# Altium footprint library ARM核心板.PcbLib: 3 footprints
Each footprint in its own frame and in the unit in brackets; x right, y up, seen from the top. Pads: shape width x height; smd on the part's side, far side on the other; paste and mask are expansions set on the pad; w line width, h text height; cw(c..) or ccw(c..) is an arc to the next point about the centre after c.
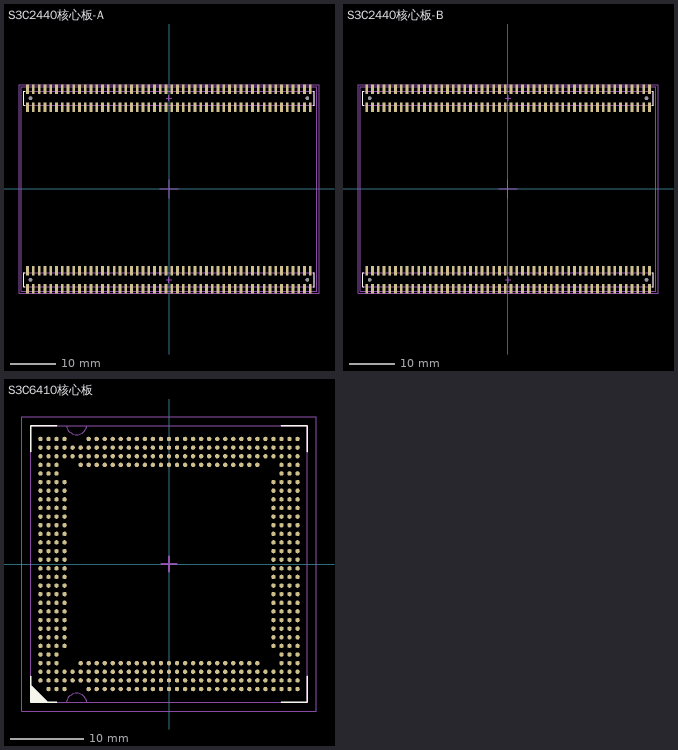
[diagram p0: the footprints below, top view; thin cyan lines are the x and y axes]

## S3C2440核心板-A [mm] "65x45mm S3C2440核心板 淘宝有售"
height 4.4
pads (204):
  rect 0.6x2.05 smd: 1(-31.127,-21.996) 2(-31.127,-18.046) 3(-29.857,-21.996) 4(-29.857,-18.046) 5(-28.587,-21.996) 6(-28.587,-18.046) 7(-27.317,-21.996) 8(-27.317,-18.046) 9(-26.047,-21.996) 10(-26.047,-18.046) 11(-24.777,-21.996) 12(-24.777,-18.046) 13(-23.507,-21.996) 14(-23.507,-18.046) 15(-22.237,-21.996) 16(-22.237,-18.046) 17(-20.967,-21.996) 18(-20.967,-18.046) 19(-19.697,-21.996) 20(-19.697,-18.046) 21(-18.427,-21.996) 22(-18.427,-18.046) 23(-17.157,-21.996) 24(-17.157,-18.046) 25(-15.887,-21.996) 26(-15.887,-18.046) 27(-14.617,-21.996) 28(-14.617,-18.046) 29(-13.347,-21.996) 30(-13.347,-18.046) 31(-12.077,-21.996) 32(-12.077,-18.046) 33(-10.807,-21.996) 34(-10.807,-18.046) 35(-9.537,-21.996) 36(-9.537,-18.046) 37(-8.267,-21.996) 38(-8.267,-18.046) 39(-6.997,-21.996) 40(-6.997,-18.046) 41(-5.727,-21.996) 42(-5.727,-18.046) 43(-4.457,-21.996) 44(-4.457,-18.046) 45(-3.187,-21.996) 46(-3.187,-18.046) 47(-1.917,-21.996) 48(-1.917,-18.046) 49(-0.647,-21.996) 50(-0.647,-18.046) 51(0.623,-21.996) 52(0.623,-18.046) 53(1.893,-21.996) 54(1.893,-18.046) 55(3.163,-21.996) 56(3.163,-18.046) 57(4.433,-21.996) 58(4.433,-18.046) 59(5.703,-21.996) 60(5.703,-18.046) 61(6.973,-21.996) 62(6.973,-18.046) 63(8.243,-21.996) 64(8.243,-18.046) 65(9.513,-21.996) 66(9.513,-18.046) 67(10.783,-21.996) 68(10.783,-18.046) 69(12.053,-21.996) 70(12.053,-18.046) 71(13.323,-21.996) 72(13.323,-18.046) 73(14.593,-21.996) 74(14.593,-18.046) 75(15.863,-21.996) 76(15.863,-18.046) 77(17.133,-21.996) 78(17.133,-18.046) 79(18.403,-21.996) 80(18.403,-18.046) 81(19.673,-21.996) 82(19.673,-18.046) 83(20.943,-21.996) 84(20.943,-18.046) 85(22.213,-21.996) 86(22.213,-18.046) 87(23.483,-21.996) 88(23.483,-18.046) 89(24.753,-21.996) 90(24.753,-18.046) 91(26.023,-21.996) 92(26.023,-18.046) 93(27.293,-21.996) 94(27.293,-18.046) 95(28.563,-21.996) 96(28.563,-18.046) 97(29.833,-21.996) 98(29.833,-18.046) 99(31.103,-21.996) 100(31.103,-18.046) 101(-31.127,18.004) 102(-31.127,21.954) 103(-29.857,18.004) 104(-29.857,21.954) 105(-28.587,18.004) 106(-28.587,21.954) 107(-27.317,18.004) 108(-27.317,21.954) 109(-26.047,18.004) 110(-26.047,21.954) 111(-24.777,18.004) 112(-24.777,21.954) 113(-23.507,18.004) 114(-23.507,21.954) 115(-22.237,18.004) 116(-22.237,21.954) 117(-20.967,18.004) 118(-20.967,21.954) 119(-19.697,18.004) 120(-19.697,21.954) 121(-18.427,18.004) 122(-18.427,21.954) 123(-17.157,18.004) 124(-17.157,21.954) 125(-15.887,18.004) 126(-15.887,21.954) 127(-14.617,18.004) 128(-14.617,21.954) 129(-13.347,18.004) 130(-13.347,21.954) 131(-12.077,18.004) 132(-12.077,21.954) 133(-10.807,18.004) 134(-10.807,21.954) 135(-9.537,18.004) 136(-9.537,21.954) 137(-8.267,18.004) 138(-8.267,21.954) 139(-6.997,18.004) 140(-6.997,21.954) 141(-5.727,18.004) 142(-5.727,21.954) 143(-4.457,18.004) 144(-4.457,21.954) 145(-3.187,18.004) 146(-3.187,21.954) 147(-1.917,18.004) 148(-1.917,21.954) 149(-0.647,18.004) 150(-0.647,21.954) 151(0.623,18.004) 152(0.623,21.954) 153(1.893,18.004) 154(1.893,21.954) 155(3.163,18.004) 156(3.163,21.954) 157(4.433,18.004) 158(4.433,21.954) 159(5.703,18.004) 160(5.703,21.954) 161(6.973,18.004) 162(6.973,21.954) 163(8.243,18.004) 164(8.243,21.954) 165(9.513,18.004) 166(9.513,21.954) 167(10.783,18.004) 168(10.783,21.954) 169(12.053,18.004) 170(12.053,21.954) 171(13.323,18.004) 172(13.323,21.954) 173(14.593,18.004) 174(14.593,21.954) 175(15.863,18.004) 176(15.863,21.954) 177(17.133,18.004) 178(17.133,21.954) 179(18.403,18.004) 180(18.403,21.954) 181(19.673,18.004) 182(19.673,21.954) 183(20.943,18.004) 184(20.943,21.954) 185(22.213,18.004) 186(22.213,21.954) 187(23.483,18.004) 188(23.483,21.954) 189(24.753,18.004) 190(24.753,21.954) 191(26.023,18.004) 192(26.023,21.954) 193(27.293,18.004) 194(27.293,21.954) 195(28.563,18.004) 196(28.563,21.954) 197(29.833,18.004) 198(29.833,21.954) 199(31.103,18.004) 200(31.103,21.954)
  round 0.75 hole 0.8 unplated: Hole(-30.492,-20.021) Hole(-30.492,19.979) Hole(30.468,-20.021) Hole(30.468,19.979)
Top Overlay:
  region: 
  lines w0.254: -31.787,-21.571 -31.952,-21.571 -31.952,-18.471 -31.787,-18.471 ; -31.787,18.429 -31.952,18.429 -31.952,21.529 -31.787,21.529 ; 31.763,-21.571 31.928,-21.571 31.928,-18.471 31.763,-18.471 ; 31.763,18.429 31.928,18.429 31.928,21.529 31.763,21.529
Mechanical 13:
  lines w0.254: -33.021,-22.988 33.021,-22.988 33.021,22.988 -33.021,22.988 -33.021,-22.988
Mechanical 15:
  lines w0.2: -0.612,-20.021 0.588,-20.021 ; -0.612,19.979 0.588,19.979 ; -0.012,-20.621 -0.012,-19.421 ; -0.012,19.379 -0.012,20.579 ; -32.524,-22.5 32.5,-22.5 32.5,22.458 -32.524,22.458 -32.524,-22.5
  lines w0.25: -31.952,-21.571 -31.952,-18.471 31.928,-18.471 31.928,-21.571 -31.952,-21.571 ; -31.952,18.429 31.928,18.429 31.928,21.529 -31.952,21.529 -31.952,18.429
  lines w0.254: -2,0 2,0 ; 0,-2 0,2
3D body: height 1.87, standoff -3.73, extent -33.021,-22.988 33.021,22.988

## S3C2440核心板-B [mm] "65x45mm S3C2440核心板 淘宝有售"
height 6
pads (204):
  rect 0.6x2.05 smd: 1(31.127,-21.996) 2(31.127,-18.046) 3(29.857,-21.996) 4(29.857,-18.046) 5(28.587,-21.996) 6(28.587,-18.046) 7(27.317,-21.996) 8(27.317,-18.046) 9(26.047,-21.996) 10(26.047,-18.046) 11(24.777,-21.996) 12(24.777,-18.046) 13(23.507,-21.996) 14(23.507,-18.046) 15(22.237,-21.996) 16(22.237,-18.046) 17(20.967,-21.996) 18(20.967,-18.046) 19(19.697,-21.996) 20(19.697,-18.046) 21(18.427,-21.996) 22(18.427,-18.046) 23(17.157,-21.996) 24(17.157,-18.046) 25(15.887,-21.996) 26(15.887,-18.046) 27(14.617,-21.996) 28(14.617,-18.046) 29(13.347,-21.996) 30(13.347,-18.046) 31(12.077,-21.996) 32(12.077,-18.046) 33(10.807,-21.996) 34(10.807,-18.046) 35(9.537,-21.996) 36(9.537,-18.046) 37(8.267,-21.996) 38(8.267,-18.046) 39(6.997,-21.996) 40(6.997,-18.046) 41(5.727,-21.996) 42(5.727,-18.046) 43(4.457,-21.996) 44(4.457,-18.046) 45(3.187,-21.996) 46(3.187,-18.046) 47(1.917,-21.996) 48(1.917,-18.046) 49(0.647,-21.996) 50(0.647,-18.046) 51(-0.623,-21.996) 52(-0.623,-18.046) 53(-1.893,-21.996) 54(-1.893,-18.046) 55(-3.163,-21.996) 56(-3.163,-18.046) 57(-4.433,-21.996) 58(-4.433,-18.046) 59(-5.703,-21.996) 60(-5.703,-18.046) 61(-6.973,-21.996) 62(-6.973,-18.046) 63(-8.243,-21.996) 64(-8.243,-18.046) 65(-9.513,-21.996) 66(-9.513,-18.046) 67(-10.783,-21.996) 68(-10.783,-18.046) 69(-12.053,-21.996) 70(-12.053,-18.046) 71(-13.323,-21.996) 72(-13.323,-18.046) 73(-14.593,-21.996) 74(-14.593,-18.046) 75(-15.863,-21.996) 76(-15.863,-18.046) 77(-17.133,-21.996) 78(-17.133,-18.046) 79(-18.403,-21.996) 80(-18.403,-18.046) 81(-19.673,-21.996) 82(-19.673,-18.046) 83(-20.943,-21.996) 84(-20.943,-18.046) 85(-22.213,-21.996) 86(-22.213,-18.046) 87(-23.483,-21.996) 88(-23.483,-18.046) 89(-24.753,-21.996) 90(-24.753,-18.046) 91(-26.023,-21.996) 92(-26.023,-18.046) 93(-27.293,-21.996) 94(-27.293,-18.046) 95(-28.563,-21.996) 96(-28.563,-18.046) 97(-29.833,-21.996) 98(-29.833,-18.046) 99(-31.103,-21.996) 100(-31.103,-18.046) 101(31.127,18.004) 102(31.127,21.954) 103(29.857,18.004) 104(29.857,21.954) 105(28.587,18.004) 106(28.587,21.954) 107(27.317,18.004) 108(27.317,21.954) 109(26.047,18.004) 110(26.047,21.954) 111(24.777,18.004) 112(24.777,21.954) 113(23.507,18.004) 114(23.507,21.954) 115(22.237,18.004) 116(22.237,21.954) 117(20.967,18.004) 118(20.967,21.954) 119(19.697,18.004) 120(19.697,21.954) 121(18.427,18.004) 122(18.427,21.954) 123(17.157,18.004) 124(17.157,21.954) 125(15.887,18.004) 126(15.887,21.954) 127(14.617,18.004) 128(14.617,21.954) 129(13.347,18.004) 130(13.347,21.954) 131(12.077,18.004) 132(12.077,21.954) 133(10.807,18.004) 134(10.807,21.954) 135(9.537,18.004) 136(9.537,21.954) 137(8.267,18.004) 138(8.267,21.954) 139(6.997,18.004) 140(6.997,21.954) 141(5.727,18.004) 142(5.727,21.954) 143(4.457,18.004) 144(4.457,21.954) 145(3.187,18.004) 146(3.187,21.954) 147(1.917,18.004) 148(1.917,21.954) 149(0.647,18.004) 150(0.647,21.954) 151(-0.623,18.004) 152(-0.623,21.954) 153(-1.893,18.004) 154(-1.893,21.954) 155(-3.163,18.004) 156(-3.163,21.954) 157(-4.433,18.004) 158(-4.433,21.954) 159(-5.703,18.004) 160(-5.703,21.954) 161(-6.973,18.004) 162(-6.973,21.954) 163(-8.243,18.004) 164(-8.243,21.954) 165(-9.513,18.004) 166(-9.513,21.954) 167(-10.783,18.004) 168(-10.783,21.954) 169(-12.053,18.004) 170(-12.053,21.954) 171(-13.323,18.004) 172(-13.323,21.954) 173(-14.593,18.004) 174(-14.593,21.954) 175(-15.863,18.004) 176(-15.863,21.954) 177(-17.133,18.004) 178(-17.133,21.954) 179(-18.403,18.004) 180(-18.403,21.954) 181(-19.673,18.004) 182(-19.673,21.954) 183(-20.943,18.004) 184(-20.943,21.954) 185(-22.213,18.004) 186(-22.213,21.954) 187(-23.483,18.004) 188(-23.483,21.954) 189(-24.753,18.004) 190(-24.753,21.954) 191(-26.023,18.004) 192(-26.023,21.954) 193(-27.293,18.004) 194(-27.293,21.954) 195(-28.563,18.004) 196(-28.563,21.954) 197(-29.833,18.004) 198(-29.833,21.954) 199(-31.103,18.004) 200(-31.103,21.954)
  round 0.75 hole 0.8 unplated: Hole(-30.468,-20.021) Hole(-30.468,19.979) Hole(30.492,-20.021) Hole(30.492,19.979)
Top Overlay:
  region: 
  lines w0.254: -31.763,-21.571 -31.928,-21.571 -31.928,-18.471 -31.763,-18.471 ; -31.763,18.429 -31.928,18.429 -31.928,21.529 -31.763,21.529 ; 31.787,-21.571 31.952,-21.571 31.952,-18.471 31.787,-18.471 ; 31.787,18.429 31.952,18.429 31.952,21.529 31.787,21.529
Mechanical 13:
  lines w0.254: -33.021,-22.988 -33.021,22.988 33.021,22.988 33.021,-22.988 -33.021,-22.988
Mechanical 15:
  lines w0.2: -0.588,-20.021 0.612,-20.021 ; -0.588,19.979 0.612,19.979 ; 0.012,-20.621 0.012,-19.421 ; 0.012,19.379 0.012,20.579 ; -32.5,-22.5 32.524,-22.5 32.524,22.458 -32.5,22.458 -32.5,-22.5
  lines w0.25: -31.928,-21.571 31.952,-21.571 31.952,-18.471 -31.928,-18.471 -31.928,-21.571 ; -31.928,18.429 -31.928,21.529 31.952,21.529 31.952,18.429 -31.928,18.429
  lines w0.254: -2,0 2,0 ; 0,-2 0,2
3D body: height 1.7, standoff -5.07, extent -33.021,-22.988 33.021,22.988

## S3C6410核心板 [mm] "37.5x37.5mm S3C6410核心板 淘宝有售"
height 2.5
pads (423):
  round 0.6 smd: A2(-17.44,-15.795) A3(-17.44,-14.625) A4(-17.44,-13.455) A5(-17.44,-12.285) A6(-17.44,-11.115) A7(-17.44,-9.945) A8(-17.44,-8.775) A9(-17.44,-7.605) A10(-17.44,-6.435) A11(-17.44,-5.265) A12(-17.44,-4.095) A13(-17.44,-2.925) A14(-17.44,-1.755) A15(-17.44,-0.585) A16(-17.44,0.585) A17(-17.44,1.755) A18(-17.44,2.925) A19(-17.44,4.095) A20(-17.44,5.265) A21(-17.44,6.435) A22(-17.44,7.605) A23(-17.44,8.775) A24(-17.44,9.945) A25(-17.44,11.115) A26(-17.44,12.285) A27(-17.44,13.455) A28(-17.44,14.625) A29(-17.44,15.795) A30(-17.44,16.965) AA1(4.36,-16.965) AA2(4.36,-15.795) AA3(4.36,-14.625) AA4(4.36,-13.455) AA27(4.36,13.455) AA28(4.36,14.625) AA29(4.36,15.795) AA30(4.36,16.965) AB1(5.45,-16.965) AB2(5.45,-15.795) AB3(5.45,-14.625) AB4(5.45,-13.455) AB27(5.45,13.455) AB28(5.45,14.625) AB29(5.45,15.795) AB30(5.45,16.965) AC1(6.54,-16.965) AC2(6.54,-15.795) AC3(6.54,-14.625) AC4(6.54,-13.455) AC27(6.54,13.455) AC28(6.54,14.625) AC29(6.54,15.795) AC30(6.54,16.965) AD1(7.63,-16.965) AD2(7.63,-15.795) AD3(7.63,-14.625) AD4(7.63,-13.455) AD27(7.63,13.455) AD28(7.63,14.625) AD29(7.63,15.795) AD30(7.63,16.965) AE1(8.72,-16.965) AE2(8.72,-15.795) AE3(8.72,-14.625) AE4(8.72,-13.455) AE27(8.72,13.455) AE28(8.72,14.625) AE29(8.72,15.795) AE30(8.72,16.965) AF1(9.81,-16.965) AF2(9.81,-15.795) AF3(9.81,-14.625) AF4(9.81,-13.455) AF27(9.81,13.455) AF28(9.81,14.625) AF29(9.81,15.795) AF30(9.81,16.965) AG1(10.9,-16.965) AG2(10.9,-15.795) AG3(10.9,-14.625) AG4(10.9,-13.455) AG27(10.9,13.455) AG28(10.9,14.625) AG29(10.9,15.795) AG30(10.9,16.965) AH1(11.99,-16.965) AH2(11.99,-15.795) AH3(11.99,-14.625) AH4(11.99,-13.455) AH27(11.99,13.455) AH28(11.99,14.625) AH29(11.99,15.795) AH30(11.99,16.965) AJ1(13.08,-16.965) AJ2(13.08,-15.795) AJ3(13.08,-14.625) AJ28(13.08,14.625) AJ29(13.08,15.795) AJ30(13.08,16.965) AK1(14.17,-16.965) AK2(14.17,-15.795) AK3(14.17,-14.625) AK6(14.17,-11.115) AK7(14.17,-9.945) AK8(14.17,-8.775) AK9(14.17,-7.605) AK10(14.17,-6.435) AK11(14.17,-5.265) AK12(14.17,-4.095) AK13(14.17,-2.925) AK14(14.17,-1.755) AK15(14.17,-0.585) AK16(14.17,0.585) AK17(14.17,1.755) AK18(14.17,2.925) AK19(14.17,4.095) AK20(14.17,5.265) AK21(14.17,6.435) AK22(14.17,7.605) AK23(14.17,8.775) AK24(14.17,9.945) AK25(14.17,11.115) AK28(14.17,14.625) AK29(14.17,15.795) AK30(14.17,16.965) AL1(15.26,-16.965) AL2(15.26,-15.795) AL3(15.26,-14.625) AL4(15.26,-13.455) AL5(15.26,-12.285) AL6(15.26,-11.115) AL7(15.26,-9.945) AL8(15.26,-8.775) AL9(15.26,-7.605) AL10(15.26,-6.435) AL11(15.26,-5.265) AL12(15.26,-4.095) AL13(15.26,-2.925) AL14(15.26,-1.755) AL15(15.26,-0.585) AL16(15.26,0.585) AL17(15.26,1.755) AL18(15.26,2.925) AL19(15.26,4.095) AL20(15.26,5.265) AL21(15.26,6.435) AL22(15.26,7.605) AL23(15.26,8.775) AL24(15.26,9.945) AL25(15.26,11.115) AL26(15.26,12.285) AL27(15.26,13.455) AL28(15.26,14.625) AL29(15.26,15.795) AL30(15.26,16.965) AM1(16.35,-16.965) AM2(16.35,-15.795) AM3(16.35,-14.625) AM4(16.35,-13.455) AM5(16.35,-12.285) AM6(16.35,-11.115) AM7(16.35,-9.945) AM8(16.35,-8.775) AM9(16.35,-7.605) AM10(16.35,-6.435) AM11(16.35,-5.265) AM12(16.35,-4.095) AM13(16.35,-2.925) AM14(16.35,-1.755) AM15(16.35,-0.585) AM16(16.35,0.585) AM17(16.35,1.755) AM18(16.35,2.925) AM19(16.35,4.095) AM20(16.35,5.265) AM21(16.35,6.435) AM22(16.35,7.605) AM23(16.35,8.775) AM24(16.35,9.945) AM25(16.35,11.115) AM26(16.35,12.285) AM27(16.35,13.455) AM28(16.35,14.625) AM29(16.35,15.795) AM30(16.35,16.965) AN1(17.44,-16.965) AN2(17.44,-15.795) AN3(17.44,-14.625) AN4(17.44,-13.455) AN5(17.44,-12.285) AN6(17.44,-11.115) AN7(17.44,-9.945) AN8(17.44,-8.775) AN9(17.44,-7.605) AN10(17.44,-6.435) AN11(17.44,-5.265) AN12(17.44,-4.095) AN13(17.44,-2.925) AN14(17.44,-1.755) AN15(17.44,-0.585) AN16(17.44,0.585) AN17(17.44,1.755) AN18(17.44,2.925) AN19(17.44,4.095) AN20(17.44,5.265) AN21(17.44,6.435) AN22(17.44,7.605) AN23(17.44,8.775) AN24(17.44,9.945) AN25(17.44,11.115) AN26(17.44,12.285) AN27(17.44,13.455) AN28(17.44,14.625) AN29(17.44,15.795) AN30(17.44,16.965) B1(-16.35,-16.965) B2(-16.35,-15.795) B3(-16.35,-14.625) B4(-16.35,-13.455) B5(-16.35,-12.285) B6(-16.35,-11.115) B7(-16.35,-9.945) B8(-16.35,-8.775) B9(-16.35,-7.605) B10(-16.35,-6.435) B11(-16.35,-5.265) B12(-16.35,-4.095) B13(-16.35,-2.925) B14(-16.35,-1.755) B15(-16.35,-0.585) B16(-16.35,0.585) B17(-16.35,1.755) B18(-16.35,2.925) B19(-16.35,4.095) B20(-16.35,5.265) B21(-16.35,6.435) B22(-16.35,7.605) B23(-16.35,8.775) B24(-16.35,9.945) B25(-16.35,11.115) B26(-16.35,12.285) B27(-16.35,13.455) B28(-16.35,14.625) B29(-16.35,15.795) B30(-16.35,16.965) C1(-15.26,-16.965) C2(-15.26,-15.795) C3(-15.26,-14.625) C4(-15.26,-13.455) C5(-15.26,-12.285) C6(-15.26,-11.115) C7(-15.26,-9.945) C8(-15.26,-8.775) C9(-15.26,-7.605) C10(-15.26,-6.435) C11(-15.26,-5.265) C12(-15.26,-4.095) C13(-15.26,-2.925) C14(-15.26,-1.755) C15(-15.26,-0.585) C16(-15.26,0.585) C17(-15.26,1.755) C18(-15.26,2.925) C19(-15.26,4.095) C20(-15.26,5.265) C21(-15.26,6.435) C22(-15.26,7.605) C23(-15.26,8.775) C24(-15.26,9.945) C25(-15.26,11.115) C26(-15.26,12.285) C27(-15.26,13.455) C28(-15.26,14.625) C29(-15.26,15.795) C30(-15.26,16.965) D1(-14.17,-16.965) D2(-14.17,-15.795) D3(-14.17,-14.625) D6(-14.17,-11.115) D7(-14.17,-9.945) D8(-14.17,-8.775) D9(-14.17,-7.605) D10(-14.17,-6.435) D11(-14.17,-5.265) D12(-14.17,-4.095) D13(-14.17,-2.925) D14(-14.17,-1.755) D15(-14.17,-0.585) D16(-14.17,0.585) D17(-14.17,1.755) D18(-14.17,2.925) D19(-14.17,4.095) D20(-14.17,5.265) D21(-14.17,6.435) D22(-14.17,7.605) D23(-14.17,8.775) D24(-14.17,9.945) D25(-14.17,11.115) D28(-14.17,14.625) D29(-14.17,15.795) D30(-14.17,16.965) E2(-13.08,-15.795) E3(-13.08,-14.625) E28(-13.08,14.625) E29(-13.08,15.795) F2(-11.99,-15.795) F3(-11.99,-14.625) F4(-11.99,-13.455) F27(-11.99,13.455) F28(-11.99,14.625) F29(-11.99,15.795) G1(-10.9,-16.965) G2(-10.9,-15.795) G3(-10.9,-14.625) G4(-10.9,-13.455) G27(-10.9,13.455) G28(-10.9,14.625) G29(-10.9,15.795) G30(-10.9,16.965) H1(-9.81,-16.965) H2(-9.81,-15.795) H3(-9.81,-14.625) H4(-9.81,-13.455) H27(-9.81,13.455) H28(-9.81,14.625) H29(-9.81,15.795) H30(-9.81,16.965) J1(-8.72,-16.965) J2(-8.72,-15.795) J3(-8.72,-14.625) J4(-8.72,-13.455) J27(-8.72,13.455) J28(-8.72,14.625) J29(-8.72,15.795) J30(-8.72,16.965) K1(-7.63,-16.965) K2(-7.63,-15.795) K3(-7.63,-14.625) K4(-7.63,-13.455) K27(-7.63,13.455) K28(-7.63,14.625) K29(-7.63,15.795) K30(-7.63,16.965) L1(-6.54,-16.965) L2(-6.54,-15.795) L3(-6.54,-14.625) L4(-6.54,-13.455) L27(-6.54,13.455) L28(-6.54,14.625) L29(-6.54,15.795) L30(-6.54,16.965) M1(-5.45,-16.965) M2(-5.45,-15.795) M3(-5.45,-14.625) M4(-5.45,-13.455) M27(-5.45,13.455) M28(-5.45,14.625) M29(-5.45,15.795) M30(-5.45,16.965) N1(-4.36,-16.965) N2(-4.36,-15.795) N3(-4.36,-14.625) N4(-4.36,-13.455) N27(-4.36,13.455) N28(-4.36,14.625) N29(-4.36,15.795) N30(-4.36,16.965) P1(-3.27,-16.965) P2(-3.27,-15.795) P3(-3.27,-14.625) P4(-3.27,-13.455) P27(-3.27,13.455) P28(-3.27,14.625) P29(-3.27,15.795) P30(-3.27,16.965) R1(-2.18,-16.965) R2(-2.18,-15.795) R3(-2.18,-14.625) R4(-2.18,-13.455) R27(-2.18,13.455) R28(-2.18,14.625) R29(-2.18,15.795) R30(-2.18,16.965) T1(-1.09,-16.965) T2(-1.09,-15.795) T3(-1.09,-14.625) T4(-1.09,-13.455) T27(-1.09,13.455) T28(-1.09,14.625) T29(-1.09,15.795) T30(-1.09,16.965) U1(0,-16.965) U2(0,-15.795) U3(0,-14.625) U4(0,-13.455) U27(0,13.455) U28(0,14.625) U29(0,15.795) U30(0,16.965) V1(1.09,-16.965) V2(1.09,-15.795) V3(1.09,-14.625) V4(1.09,-13.455) V27(1.09,13.455) V28(1.09,14.625) V29(1.09,15.795) V30(1.09,16.965) W1(2.18,-16.965) W2(2.18,-15.795) W3(2.18,-14.625) W4(2.18,-13.455) W27(2.18,13.455) W28(2.18,14.625) W29(2.18,15.795) W30(2.18,16.965) Y1(3.27,-16.965) Y2(3.27,-15.795) Y3(3.27,-14.625) Y4(3.27,-13.455) Y27(3.27,13.455) Y28(3.27,14.625) Y29(3.27,15.795) Y30(3.27,16.965)
Top Overlay:
  lines w0.254: -18.75,-18.466 -18.466,-18.75 ; -18.75,-18.186 -18.186,-18.75 ; -18.75,-17.856 -17.856,-18.75 ; -18.75,-17.526 -17.526,-18.75 ; -18.75,-17.196 -17.196,-18.75 ; -18.75,-16.866 -16.866,-18.75 ; -18.75,-16.535 -16.535,-18.75 ; -18.75,-15.245 -18.75,-18.75 -15.245,-18.75 ; -18.75,15.245 -18.75,18.75 -15.245,18.75 ; 15.245,-18.75 18.75,-18.75 18.75,-15.245 ; 15.245,18.75 18.75,18.75 18.75,15.245
Mechanical 2:
  lines w0.127: -13.921,18.75 ccw(c-12.535,18.95) -11.149,18.749 ; -13.919,18.75 -18.75,18.75 -18.75,-18.75 -13.921,-18.75 cw(c-12.535,-18.95) -11.149,-18.749 ; -11.149,-18.75 18.75,-18.75 18.75,18.75 -11.149,18.75
Mechanical 13:
  lines w0.1: -18.75,-18.75 -18.75,18.75 18.75,18.75 18.75,-18.75 -18.75,-18.75
Mechanical 15:
  lines w0.127: -13.921,18.75 ccw(c-12.535,18.95) -11.149,18.749 ; -13.919,18.75 -18.75,18.75 -18.75,-18.75 -13.921,-18.75 cw(c-12.535,-18.95) -11.149,-18.749 ; -11.149,-18.75 18.75,-18.75 18.75,18.75 -11.149,18.75 ; -20,-20 20,-20 20,20 -20,20 -20,-20
  lines w0.254: -1,0 1,0 ; 0,-1 0,1
  text "AL" at 14.771,-18.288 h0.8
  text "AK" at 13.628,-18.288 h0.8
  text "AJ" at 12.587,-18.288 h0.8
  text "AH" at 11.418,-18.288 h0.8
  text "AG" at 10.326,-18.288 h0.8
  text "AF" at 9.31,-18.288 h0.8
  text "AE" at 8.167,-18.288 h0.8
  text "AD" at 7.075,-18.288 h0.8
  text "AC" at 6.008,-18.288 h0.8
  text "AB" at 4.916,-18.288 h0.8
  text "AA" at 3.849,-18.288 h0.8
  text "Y" at 2.958,-18.237 h0.8
  text "W" at 1.792,-18.237 h0.8
  text "V" at 0.799,-18.237 h0.8
  text "U" at -0.242,-18.237 h0.8
  text "R" at -2.427,-18.237 h0.8
  text "P" at -3.519,-18.237 h0.8
  text "N" at -4.611,-18.237 h0.8
  text "M" at -5.703,-18.237 h0.8
  text "L" at -6.796,-18.237 h0.8
  text "K" at -7.888,-18.237 h0.8
  text "J" at -8.98,-18.237 h0.8
  text "H" at -10.072,-18.237 h0.8
  text "G" at -11.139,-18.237 h0.8
  text "F" at -12.206,-18.263 h0.8
  text "E" at -13.31,-18.263 h0.8
  text "D" at -14.413,-18.263 h0.8
  text "C" at -15.531,-18.263 h0.8
  text "B" at -16.572,-18.263 h0.8
  text "A" at -17.665,-18.263 h0.8
  text "T" at -1.36,-18.237 h0.8
  text "AM" at 15.736,-18.288 h0.8
  text "AN" at 16.879,-18.288 h0.8
  text "1" at -18.503,-17.196 h0.8
  text "2" at -18.503,-15.977 h0.8
  text "3" at -18.503,-14.859 h0.8
  text "4" at -18.503,-13.691 h0.8
  text "5" at -18.503,-12.497 h0.8
  text "6" at -18.503,-11.328 h0.8
  text "7" at -18.503,-10.16 h0.8
  text "8" at -18.503,-8.992 h0.8
  text "9" at -18.503,-7.798 h0.8
  text "10" at -18.503,-6.629 h0.8
  text "11" at -18.503,-5.436 h0.8
  text "12" at -18.503,-4.267 h0.8
  text "13" at -18.503,-3.124 h0.8
  text "14" at -18.503,-1.981 h0.8
  text "15" at -18.503,-0.787 h0.8
  text "16" at -18.503,0.406 h0.8
  text "18" at -18.503,2.718 h0.8
  text "19" at -18.503,3.861 h0.8
  text "20" at -18.503,5.08 h0.8
  text "21" at -18.503,6.248 h0.8
  text "22" at -18.503,7.417 h0.8
  text "23" at -18.503,8.56 h0.8
  text "24" at -18.503,9.754 h0.8
  text "25" at -18.503,10.922 h0.8
  text "26" at -18.503,12.09 h0.8
  text "27" at -18.503,13.284 h0.8
  text "28" at -18.503,14.453 h0.8
  text "29" at -18.503,15.596 h0.8
  text "30" at -18.503,16.789 h0.8
  text "17" at -18.511,1.549 h0.8
3D body: height 2.81, standoff 0.33, extent -18.75,-18.75 18.75,18.751